# Altium footprint library ALL.PcbLib: 385 footprints (part 2 of 25)
Each footprint in its own frame and in the unit in brackets; x right, y up, seen from the top. Pads: shape width x height; smd on the part's side, far side on the other; paste and mask are expansions set on the pad; w line width, h text height; cw(c..) or ccw(c..) is an arc to the next point about the centre after c.
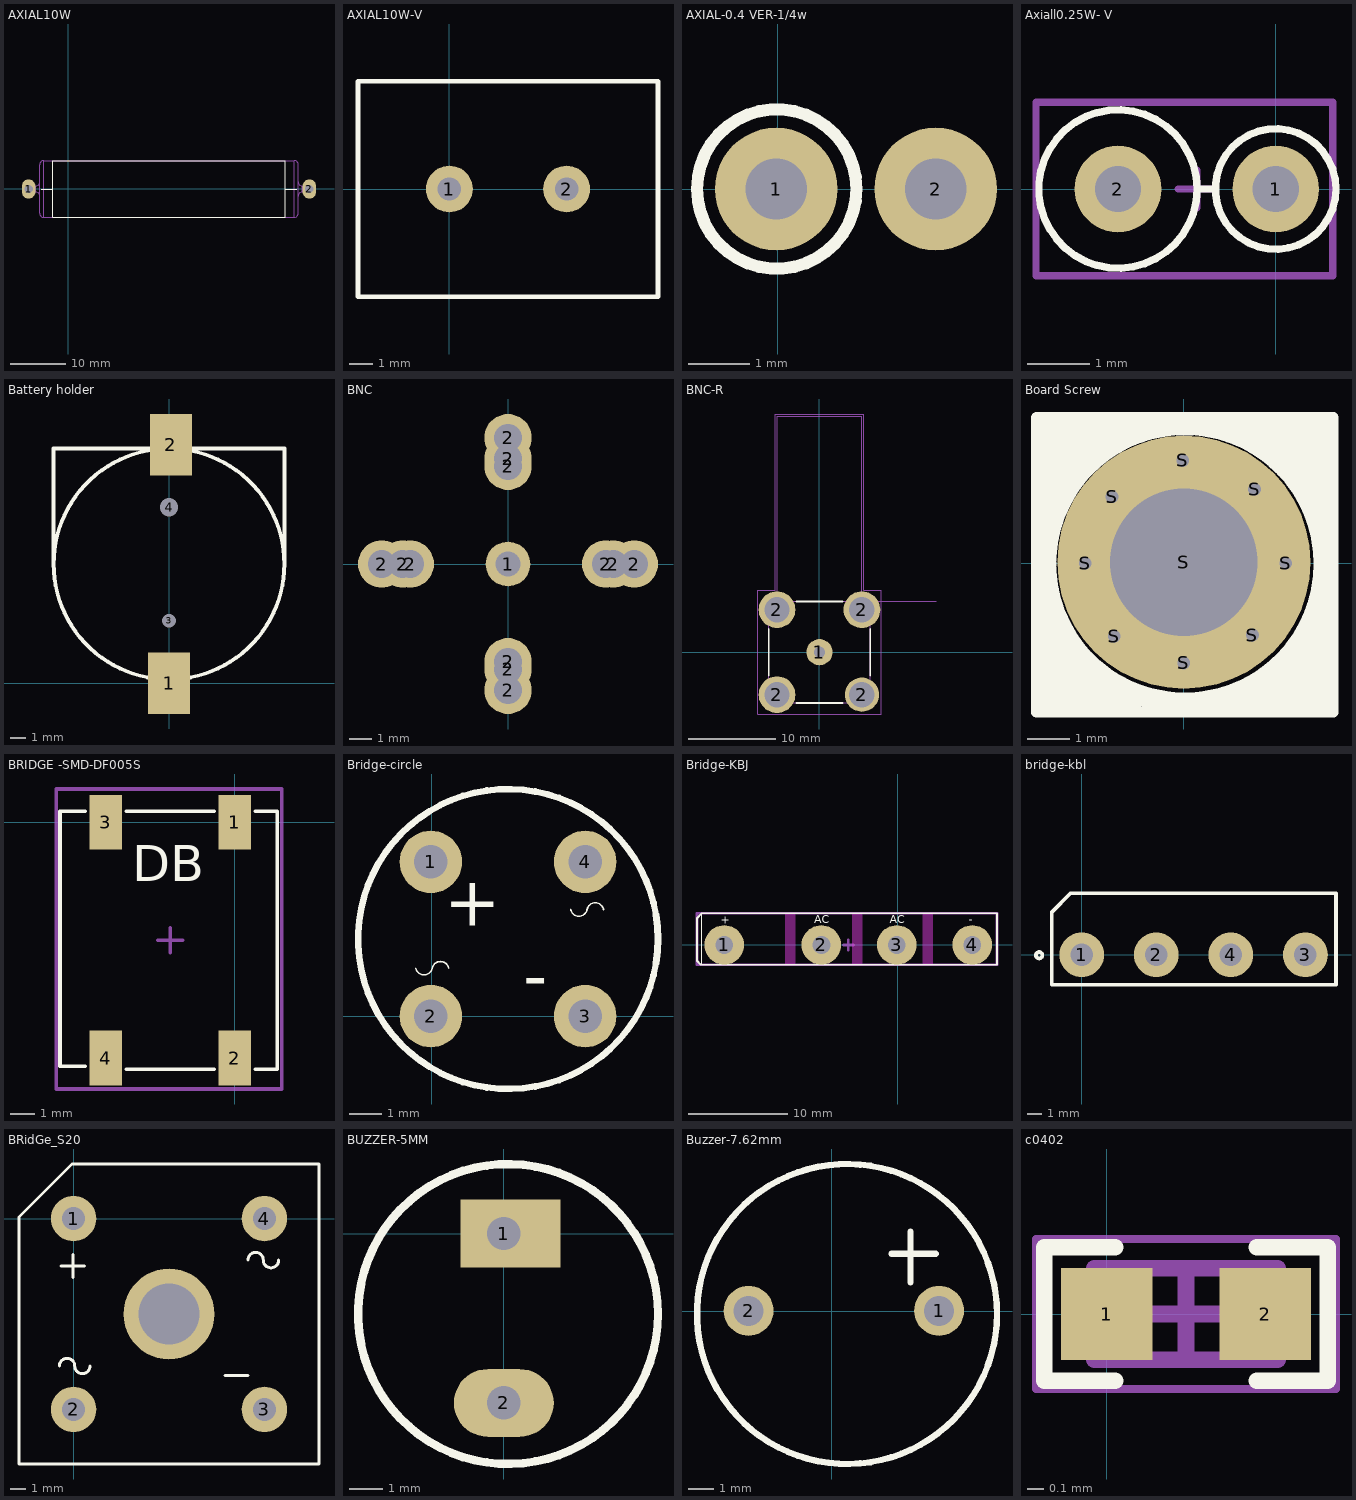
[diagram p1: the footprints below, top view; thin cyan lines are the x and y axes]

## AXIAL10W [mm]
pads (2):
  oval 2.5x3.5 hole 1.5: 1(-7.141,-0.086) 2(43.659,-0.086)
Top Overlay:
  lines w0.2: -4.855,-0.086 -2.823,-0.086 ; 39.341,-0.086 41.373,-0.086 ; -2.823,-5.166 -2.823,4.994 39.341,4.994 39.341,-5.166 -2.823,-5.166
Mechanical 13:
  lines w0.127: -6.074,-0.62 -6.074,0.447 ; -5.134,-1.382 ccw(c-5.896,-1.382) -5.896,-0.62 ; -5.134,1.209 cw(c-5.896,1.209) -5.896,0.447 ; 41.653,-1.382 cw(c42.415,-1.382) 42.415,-0.62 ; 41.653,1.209 ccw(c42.415,1.209) 42.415,0.447 ; 42.592,-0.62 42.592,0.447 ; -5.896,-0.62 -7.141,-0.62 cw(c-7.141,-0.086) -7.141,0.447 -5.896,0.447 ; -5.896,-0.62 -5.896,0.447 ; -4.372,-5.243 cw(c-4.372,-4.481) -5.134,-4.481 -5.134,4.308 cw(c-4.372,4.308) -4.372,5.07 ; -4.372,-5.243 40.891,-5.243 ; -4.372,-5.243 -4.372,5.07 ; -4.372,5.07 40.891,5.07 ; 40.891,-5.243 ccw(c40.891,-4.481) 41.653,-4.481 41.653,4.308 ccw(c40.891,4.308) 40.891,5.07 ; 40.891,-5.243 40.891,5.07 ; 42.415,-0.62 43.659,-0.62 ccw(c43.659,-0.086) 43.659,0.447 42.415,0.447 ; 42.415,-0.62 42.415,0.447
3D body "Power Res RS010.STEP": height 10.27, standoff -2.54, extent -7.674,-5.232 44.193,5.06

## AXIAL10W-V [mm]
pads (2):
  round 2 hole 1: 1(0,0) 2(5,0)
Top Overlay:
  lines w0.2: -3.9,-4.6 -3.9,4.6 8.9,4.6 8.9,-4.6 -3.9,-4.6
3D body "User Library-Cement Power Resistor SQM-10 10W R10.step": height 51, standoff -5, extent -3.75,-4.5 8.75,4.5

## AXIAL-0.4 VER-1/4w [mm]
pads (2):
  round 2 hole 1: 1(-0.025,0) 2(2.575,0)
Top Overlay:
  circle w0.2: c-0.015,0 r1.3
3D body "User Library-RESAD250W60L650D230_0_25W.STEP": height 9.83, standoff -2.47, extent -1.161,-1.15 2.785,1.15

## Axiall0.25W- V [mm]
pads (2):
  round 1.4 hole 0.75: 1(0,0) 2(-2.55,0)
Top Overlay:
  circle w0.12: c-2.55,0 r1.281
  circle w0.12: c0,0 r0.975
  lines w0.12: -1.269,0 -0.975,0
Mechanical 15:
  lines w0.12: -1.575,0 -0.975,0 ; -1.275,-0.3 -1.275,0.3 ; -3.875,-1.4 -3.875,1.4 0.925,1.4 0.925,-1.4 -3.875,-1.4
3D body "User Library-Resistor 0_25w_2_54mm.STEP": height 9.4, standoff -2, extent -3.75,-1.2 0.29,1.2

## Battery holder [mil]
pads (4):
  rect 110x160 smd: 1(0,0) 2(5,620)
  round 31.5 hole 35.43: 3(0,162.5)
  round 43.31 hole 47.24: 4(0,457.5)
Top Overlay:
  circle w10: c0,310 r300
  lines w10: -300,310 -300,610 300,610 300,310
3D body "User Library-Battery Holder for CR1220 SMD.STEP": height 178.52, standoff -8.49, extent -290,-65 290.66,675.18

## BNC [mil]
pads (13):
  round 80 hole 45: 1(0,0)
  round 85 hole 50: 2(-226.38,0) 2(-188.98,0) 2(-175.2,0) 2(0,-226.38) 2(0,-188.98) 2(0,-175.2) 2(0,175.2) 2(0,188.98) 2(0,226.38) 2(175.2,0) 2(188.98,0) 2(226.38,0)
3D body "BNC_complex.STEP": height 1369.68, standoff -173.23, extent -278,-278.21 278,278.2

## BNC-R [mm]
pads (5):
  round 3 hole 1.3: 1(0,0)
  round 4.2 hole 2.9: 2(-4.85,-4.85) 2(-4.85,4.85) 2(4.85,4.85)
  round 3.916 hole 2.9: 2(4.85,-4.85)
Top Overlay:
  lines w0.2: -5.8,-2.65 -5.8,2.65 ; -2.65,-5.8 2.65,-5.8 ; -2.65,5.8 2.65,5.8 ; 5.8,-2.65 5.8,2.65
Mechanical 13:
  lines w0.1: 13.35,5.8 5.8,5.8 ; -4.825,5.8 -4.825,26.95 4.825,26.95 4.825,5.8 ; -4.825,5.8 4.825,5.8 ; -4.825,5.8 -5.8,5.8 -5.8,-5.8 5.8,-5.8 5.8,5.8 ; 4.825,5.8 5.8,5.8
  text "PCB Edge" at 7.5,6.15 h1.27
Mechanical 15:
  lines w0.05: -7.06,-7.06 -7.06,7.06 -5.075,7.06 -5.075,27.2 5.075,27.2 5.075,7.06 7.06,7.06 7.06,-7.06 -7.06,-7.06
3D body "BNC7T-J-P-GN-RA-BH1.stp": height 19, standoff -3.3, extent -8.255,-5.834 7.745,26.916

## Board Screw [mm]
pads (9):
  round 0.6 hole 0.3: S(-2.337,0) S(-1.702,1.575) S(-1.651,-1.727) S(-0.025,2.438) S(0,-2.362) S(1.626,-1.702) S(1.676,1.753) S(2.413,0)
  round 6 hole 3.5 mask+0.1: S(0,0.025)
Top Layer:
  circle w0.254: c0,0.025 r2.392
Top Overlay:
  circle w0.5: c0.025,-0.012 r3.3
  region: -3.429,-1.067 -3.378,-1.118 -3.378,-3.556 -0.864,-3.556 -3.378,-1.041
  region: 1.016,-3.505 1.067,-3.454 3.505,-3.454 3.505,-0.94 0.991,-3.454
  region: 3.607,0.838 3.556,0.889 3.556,3.327 1.041,3.327 3.556,0.813
  region: -1.016,3.48 -1.067,3.429 -3.505,3.429 -3.505,0.914 -0.991,3.429
  lines w0.254: -3.494,-3.511 -3.494,3.454 3.542,3.454 3.542,-3.528 -3.492,-3.528
Bottom Overlay:
  circle w0.7: c0.025,-0.012 r3.3
  region: 3.505,3.477 3.502,3.48 0.763,3.48 0.763,3.431 3.505,0.688
  region: -3.492,-3.528 -3.489,-3.531 -0.749,-3.531 -0.749,-3.482 -3.492,-0.739
  region: 3.559,-3.526 3.556,-3.528 0.816,-3.528 0.816,-3.479 3.559,-0.736
  region: -3.492,3.505 -3.489,3.508 -0.749,3.508 -0.749,3.458 -3.492,0.716
  lines w0.254: -3.494,-3.511 -3.494,3.522 3.539,3.522 ; -3.492,-3.528 3.542,-3.528 3.542,3.505
3D body "User Library-User Library-4-40 x _125 sems.STEP": height 2.34, standoff -3, extent -2.667,-2.642 2.692,2.718

## BRIDGE -SMD-DF005S [mm]
pads (4):
  rect 1.3x2.2 smd: 1(0,0) 2(0,-9.5) 3(-5.2,0) 4(-5.2,-9.5)
Top Overlay:
  lines w0.15: -6.029,-9.83 -7.045,-9.83 -7.045,0.457 -6.029,0.457 ; -4.378,-9.957 -0.822,-9.957 ; -4.378,0.457 -0.822,0.457 ; 0.829,-9.957 1.718,-9.957 1.718,0.457 0.829,0.457
  text "DB" at -4.124,-2.845 h2.5
Mechanical 15:
  lines w0.15: -3.1,-4.75 -2.1,-4.75 ; -2.6,-5.25 -2.6,-4.25 ; -7.2,-10.75 1.9,-10.75 1.9,1.35 -7.2,1.35 -7.2,-10.75
3D body "User Library-DFXXS.STEP": height 3.58, standoff 0.01, extent -6.915,-9.849 1.595,0.451

## Bridge-circle [mil]
pads (4):
  round 75 hole 40: 1(-1,185.04) 2(-1,0) 3(184.04,0) 4(184.04,185.04)
Top Overlay:
  circle w7.87: c91.52,92.52 r180
  lines w1.97: -19.11,57.48 ccw(c-9.27,59.45) 0.57,57.48 cw(c10.42,55.51) 20.26,57.48 ; 166.72,127.95 ccw(c176.56,129.92) 186.4,127.95 cw(c196.24,125.98) 206.09,127.95
  text "-" at 109.63,19.68 h59.06
  text "+" at 15.14,108.66 h59.06
3D body "bridge.STEP": height 205.12, standoff -74.8, extent -67.66,-67.87 251.24,251.03

## Bridge-KBJ [mm]
pads (4):
  round 4 hole 1.8: 1(-17.51,0) 2(-7.7,0) 3(-0.08,0)
  round 4 hole 1.8 slot 1.7 at 0 deg: 4(7.54,0)
Top Overlay:
  lines w0.1: -19.76,-2 -19.76,3.1
  lines w0.2: -20.26,-1.6 -19.86,-2 10.04,-2 10.04,3.2 -19.76,3.2 -20.26,2.7 -20.26,-1.6
  text "+" at -17.837,2.159 h0.8
  text "-" at 7.182,2.21 h0.8
  text "AC" at -0.794,2.21 h0.8
  text "AC" at -8.439,2.184 h0.8
Keep-Out Layer:
  board cut-out: -11.36,3.2 -10.36,3.2 -10.36,-1.9 -11.36,-1.9
  board cut-out: -4.56,3.1 -3.56,3.1 -3.56,-2 -4.56,-2
  board cut-out: 2.565,3.1 3.565,3.1 3.565,-2 2.565,-2
Keep-Out Layer:
  lines w1: -10.86,-1.425 -10.86,2.725 ; -4.06,-1.525 -4.06,2.625 ; 3.04,-1.525 3.04,2.625
Mechanical 15:
  lines w0.3: -5.485,0 -4.46,0 ; -4.985,-0.5 -4.985,0.5 ; -20.26,-2 10.04,-2 10.04,3.2 -20.26,3.2 -20.26,-2
3D body "User Library-KBJ-GSIB.STEP": height 24.25, standoff -14.71, extent -20.056,-1.8 9.94,3

## bridge-kbl [mil]
pads (4):
  round 120 hole 60: 1(0,0) 2(200,0) 3(600,0) 4(400,0)
Top Overlay:
  circle w10: c-114,-1 r8.54
  lines w10: -80,-80 682,-80 682,165 -30,165 -80,115 -80,-80
3D body "User Library-Silicon Bridge Rectifiers KBL04.step": height 677.17, standoff -992.13, extent -73.02,-72.31 675.01,158

## BRidGe_S20 [mm]
pads (5):
  round 3 hole 1.5: 1(0,0) 2(0,-12.6) 3(12.6,-12.6) 4(12.6,0)
  round 6 hole 4: ""(6.3,-6.3)
Top Overlay:
  lines w0.2: -0.939,-9.729 cw(c-0.431,-9.729) 0.077,-9.729 ccw(c0.585,-9.729) 1.093,-9.729 ; -0.812,-3.125 0.712,-3.125 ; -0.05,-3.887 -0.05,-2.363 ; 9.983,-10.364 11.507,-10.364 ; 11.507,-2.744 cw(c12.015,-2.744) 12.523,-2.744 ccw(c13.031,-2.744) 13.539,-2.744 ; -3.6,-16.2 16.2,-16.2 16.2,3.6 -0.1,3.6 -3.6,0.1 -3.6,-16.2
3D body "User Library-BR-8.step": height 7.5, standoff -3.5, extent -3.5,-16.1 16.1,3.5

## BUZZER-5MM [mm]
pads (2):
  rect 3x2.032 hole 1 copper offset 0.2,0: 1(0,0)
  oval 3x2.032 hole 1: 2(0,-5.08)
Top Overlay:
  circle w0.254: c0.127,-2.413 r4.5
3D body "KXG0903C1--3DModel-STEP-532303.STEP": height 0.13, standoff -10.37, extent -4.469,-6.985 5.131,2.615

## Buzzer-7.62mm [mm]
pads (2):
  round 2 hole 1.2: 1(4.293,0.023) 2(-3.327,0.023)
Top Overlay:
  circle w0.254: c0.61,-0.104 r6
  lines w0.254: 2.388,2.309 4.166,2.309 ; 3.15,1.166 3.15,3.198
3D body "AI-1223-TWT-12V-R--3DModel-STEP-1 (1).STEP": height 10.05, standoff -5.5, extent -5.947,-6.096 7.493,5.903

## c0402 [mm]
pads (2):
  rect 0.55x0.55 smd mask+0.06: 1(0,0) 2(0.95,0)
Top Overlay:
  lines w0.1: 0.05,-0.4 -0.375,-0.4 -0.375,0.4 0.05,0.4 ; 0.9,-0.4 1.325,-0.4 1.325,0.4 0.9,0.4
Mechanical 13:
  lines w0.1: -0.075,-0.275 1.025,-0.275 1.025,0.275 -0.075,0.275 -0.075,-0.275
Mechanical 15:
  lines w0.05: -0.425,-0.45 1.375,-0.45 1.375,0.45 -0.425,0.45 -0.425,-0.45
  lines w0.1: 0.2,0 0.75,0 ; 0.475,-0.275 0.475,0.275
3D body "User Library-FB_1005.STEP": height 0.5, standoff 0, extent -0.025,-0.25 0.975,0.25